# Altium footprint library PcbLib1.PcbLib: 1009 footprints (part 27 of 64)
Each footprint in its own frame and in the unit in brackets; x right, y up, seen from the top. Pads: shape width x height; smd on the part's side, far side on the other; paste and mask are expansions set on the pad; w line width, h text height; cw(c..) or ccw(c..) is an arc to the next point about the centre after c.
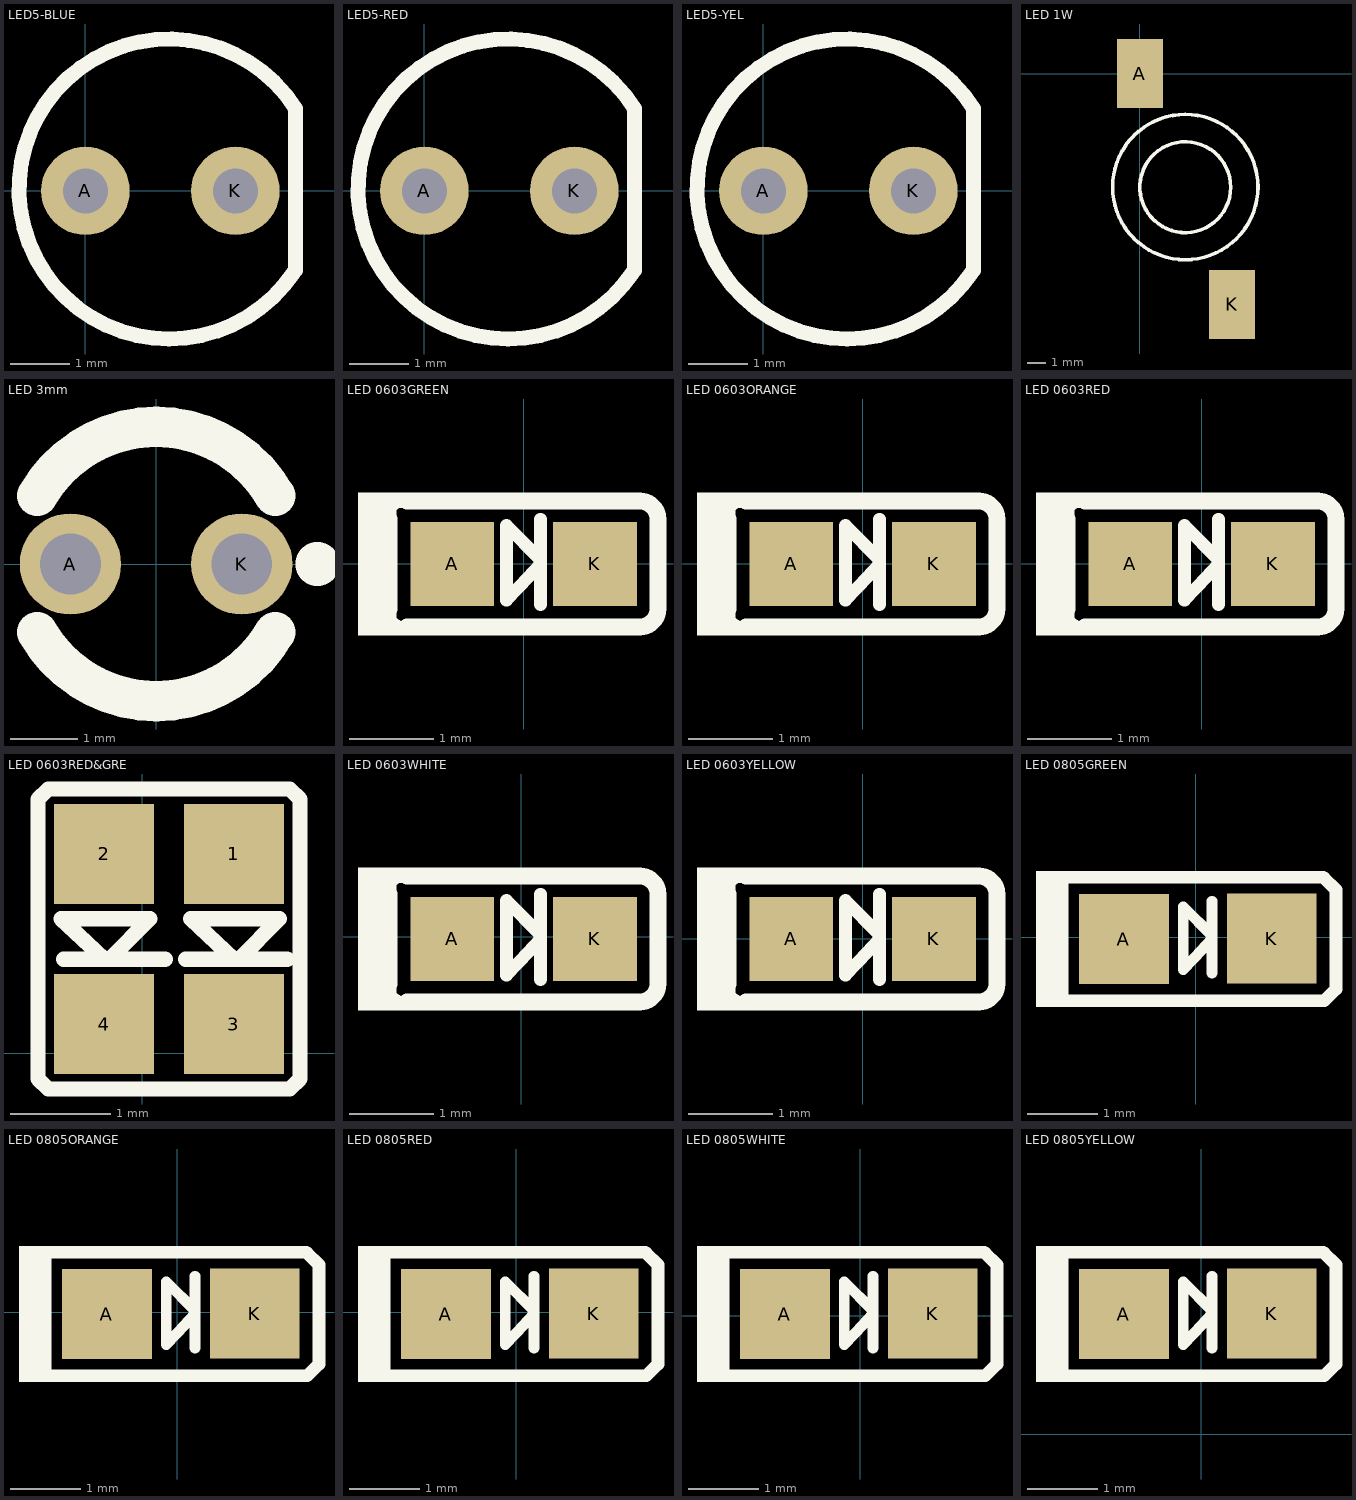
[diagram p26: the footprints below, top view; thin cyan lines are the x and y axes]

## LED5-BLUE [mm]
pads (2):
  round 1.5 hole 0.762: A(0,0) K(2.54,0)
Top Overlay:
  lines w0.254: 3.528,-1.378 cw(c1.415,0.031) 3.556,1.397 3.556,-1.35
3D body "LED5_BLUE.STEP": height 8.6, standoff -2, extent -1.58,-2.85 3.77,2.85

## LED5-RED [mm]
pads (2):
  round 1.5 hole 0.762: A(0,0) K(2.54,0)
Top Overlay:
  lines w0.254: 3.528,-1.378 cw(c1.415,0.031) 3.556,1.397 3.556,-1.35
3D body "LED5_RED.STEP": height 8.6, standoff -2, extent -1.58,-2.85 3.77,2.85

## LED5-YEL [mm]
pads (2):
  round 1.5 hole 0.762: A(0,0) K(2.54,0)
Top Overlay:
  lines w0.254: 3.528,-1.378 cw(c1.415,0.031) 3.556,1.397 3.556,-1.35
3D body "LED5_YEL.STEP": height 8.6, standoff -2, extent -1.58,-2.85 3.77,2.85

## LED 1W [mm]
pads (2):
  rect 2.54x3.81 smd: A(0,0) K(5.08,-12.7)
Top Overlay:
  circle w0.2: c2.5,-6.242 r4
  circle w0.2: c2.5,-6.25 r2.5
3D body: height 0.5, standoff 0.25, extent -1,-1.5 1,1.5
3D body: height 0.5, standoff 0.25, extent 4,-14.25 6,-11
3D body: height 5.55, standoff 0.55, extent 0.026,-8.729 5,-3.75
3D body: height 3.25, standoff 0.25, extent -1.468,-10.234 6.5,-2.25
3D body: height 0.89, standoff 0.25, extent 4,-11 6,-8
3D body: height 0.89, standoff 0.25, extent -1,-5.25 1,-1.5

## LED 3mm [mm]
pads (2):
  round 1.5 hole 0.9 mask+0.051: A(-1.27,0) K(1.27,0)
Top Overlay:
  circle w0.6: c2.388,0 r0.025
  lines w0.6: -1.764,-1.008 ccw(c0,0) 1.764,-1.008 ; -1.764,1.008 cw(c0,0) 1.764,1.008

## LED 0603GREEN [mm]
pads (2):
  rect 1x1 smd paste+0 mask+0: A(-0.85,0) K(0.85,0)
Top Overlay:
  rectangle: -1.782,-0.851 -1.198,-0.686
  rectangle: -1.973,-0.851 -1.516,0.851
  rectangle: -1.782,0.665 -1.132,0.851
  lines w0.102: -1.602,-0.533 ccw(c-1.386,-0.533) -1.386,-0.749 ; -1.602,0.533 cw(c-1.386,0.533) -1.386,0.749
  lines w0.152: 0.203,-0.483 0.203,0.533 ; 0.203,0 -0.203,-0.432 -0.203,0.457 0.203,0.051
  lines w0.2: 1.386,-0.749 ccw(c1.386,-0.533) 1.602,-0.533 ; 1.386,0.749 cw(c1.386,0.533) 1.602,0.533
  lines w0.203: -1.602,-0.533 -1.602,0.533 ; -1.386,-0.749 1.386,-0.749 ; -1.386,0.749 1.386,0.749 ; 1.602,-0.533 1.602,0.533
3D body: height 0.46, standoff 0, extent -0.301,-0.464 0.493,0.402
3D body: height 0.38, standoff 0, extent -0.502,-0.533 0.668,0.533
3D body: height 0.38, standoff 0, extent -0.925,-0.535 -0.5,0.535
3D body: height 0.38, standoff 0, extent 0.664,-0.532 1.089,0.532
3D body: height 0.46, standoff 0, extent -0.267,-0.254 0.268,0.305

## LED 0603ORANGE [mm]
pads (2):
  rect 1x1 smd paste+0 mask+0: A(-0.85,0) K(0.85,0)
Top Overlay:
  rectangle: -1.782,0.665 -1.132,0.851
  rectangle: -1.973,-0.851 -1.516,0.851
  rectangle: -1.782,-0.851 -1.198,-0.686
  lines w0.102: -1.602,-0.533 ccw(c-1.386,-0.533) -1.386,-0.749 ; -1.602,0.533 cw(c-1.386,0.533) -1.386,0.749
  lines w0.152: 0.203,-0.483 0.203,0.533 ; 0.203,0 -0.203,-0.432 -0.203,0.457 0.203,0.051
  lines w0.2: 1.386,-0.749 ccw(c1.386,-0.533) 1.602,-0.533 ; 1.386,0.749 cw(c1.386,0.533) 1.602,0.533
  lines w0.203: -1.602,-0.533 -1.602,0.533 ; -1.386,-0.749 1.386,-0.749 ; -1.386,0.749 1.386,0.749 ; 1.602,-0.533 1.602,0.533
3D body: height 0.46, standoff 0, extent -0.301,-0.464 0.493,0.402
3D body: height 0.38, standoff 0, extent -0.502,-0.533 0.668,0.533
3D body: height 0.38, standoff 0, extent -0.925,-0.535 -0.5,0.535
3D body: height 0.38, standoff 0, extent 0.664,-0.532 1.089,0.532
3D body: height 0.46, standoff 0, extent -0.267,-0.254 0.268,0.305

## LED 0603RED [mm]
pads (2):
  rect 1x1 smd paste+0 mask+0: A(-0.85,0) K(0.85,0)
Top Overlay:
  rectangle: -1.782,-0.851 -1.198,-0.686
  rectangle: -1.973,-0.851 -1.516,0.851
  rectangle: -1.782,0.665 -1.132,0.851
  lines w0.102: -1.602,-0.533 ccw(c-1.386,-0.533) -1.386,-0.749 ; -1.602,0.533 cw(c-1.386,0.533) -1.386,0.749
  lines w0.152: 0.203,-0.483 0.203,0.533 ; 0.203,0 -0.203,-0.432 -0.203,0.457 0.203,0.051
  lines w0.2: 1.386,-0.749 ccw(c1.386,-0.533) 1.602,-0.533 ; 1.386,0.749 cw(c1.386,0.533) 1.602,0.533
  lines w0.203: -1.602,-0.533 -1.602,0.533 ; -1.386,-0.749 1.386,-0.749 ; -1.386,0.749 1.386,0.749 ; 1.602,-0.533 1.602,0.533
3D body: height 0.38, standoff 0, extent 0.664,-0.532 1.089,0.532
3D body: height 0.38, standoff 0, extent -0.925,-0.535 -0.5,0.535
3D body: height 0.38, standoff 0, extent -0.502,-0.533 0.668,0.533
3D body: height 0.46, standoff 0, extent -0.301,-0.464 0.493,0.402
3D body: height 0.46, standoff 0, extent -0.267,-0.254 0.268,0.305

## LED 0603RED&GRE [mm]
pads (4):
  rect 1x1 smd paste+0 mask+0: 1(0.914,1.993) 2(-0.381,1.993) 3(0.914,0.293) 4(-0.381,0.293)
Top Overlay:
  lines w0.152: -0.787,0.94 0.229,0.94 ; -0.381,0.94 -0.813,1.346 0.076,1.346 -0.33,0.94 ; 0.432,0.94 1.448,0.94 ; 0.914,0.94 0.483,1.346 1.372,1.346 0.965,0.94 ; -1.041,-0.254 -1.041,2.54 -0.94,2.642 1.473,2.642 1.575,2.54 1.575,-0.254 1.473,-0.356 -0.94,-0.356 -1.041,-0.254
3D body: height 0.46, standoff 0, extent -0.845,0.65 0.021,1.444
3D body: height 0.38, standoff 0, extent -0.914,0.475 0.152,1.645
3D body: height 0.38, standoff 0, extent -0.916,1.643 0.154,2.068
3D body: height 0.38, standoff 0, extent -0.913,0.054 0.151,0.479
3D body: height 0.46, standoff 0, extent 0.45,0.65 1.316,1.444
3D body: height 0.38, standoff 0, extent 0.381,0.475 1.448,1.645
3D body: height 0.38, standoff 0, extent 0.38,1.643 1.449,2.068
3D body: height 0.38, standoff 0, extent 0.383,0.054 1.446,0.479
3D body: height 0.46, standoff 0, extent -0.635,0.875 -0.076,1.41
3D body: height 0.46, standoff 0, extent 0.661,0.875 1.219,1.41

## LED 0603WHITE [mm]
pads (2):
  rect 1x1 smd paste+0 mask+0: A(-0.825,-0.025) K(0.875,-0.025)
Top Overlay:
  rectangle: -1.757,0.64 -1.107,0.825
  rectangle: -1.947,-0.876 -1.49,0.825
  rectangle: -1.757,-0.876 -1.173,-0.711
  lines w0.102: -1.576,-0.559 ccw(c-1.36,-0.559) -1.36,-0.775 ; -1.576,0.508 cw(c-1.36,0.508) -1.36,0.724
  lines w0.152: 0.229,-0.508 0.229,0.508 ; 0.229,-0.025 -0.178,-0.457 -0.178,0.432 0.229,0.025
  lines w0.2: 1.411,-0.775 ccw(c1.411,-0.559) 1.627,-0.559 ; 1.411,0.724 cw(c1.411,0.508) 1.627,0.508
  lines w0.203: -1.576,-0.559 -1.576,0.508 ; -1.36,-0.775 1.411,-0.775 ; -1.36,0.724 1.411,0.724 ; 1.627,-0.559 1.627,0.508
3D body: height 0.46, standoff 0, extent -0.242,-0.279 0.293,0.28
3D body: height 0.5, standoff 0, extent -0.965,-0.66 -0.737,0.61
3D body: height 0.5, standoff 0, extent 0.787,-0.66 1.016,0.61
3D body: height 0.5, standoff 0, extent -0.737,-0.66 0.787,0.61

## LED 0603YELLOW [mm]
pads (2):
  rect 1x1 smd paste+0 mask+0: A(-0.85,0) K(0.85,0)
Top Overlay:
  rectangle: -1.782,-0.851 -1.198,-0.686
  rectangle: -1.973,-0.851 -1.516,0.851
  rectangle: -1.782,0.665 -1.132,0.851
  lines w0.102: -1.602,-0.533 ccw(c-1.386,-0.533) -1.386,-0.749 ; -1.602,0.533 cw(c-1.386,0.533) -1.386,0.749
  lines w0.152: 0.203,-0.483 0.203,0.533 ; 0.203,0 -0.203,-0.432 -0.203,0.457 0.203,0.051
  lines w0.2: 1.386,-0.749 ccw(c1.386,-0.533) 1.602,-0.533 ; 1.386,0.749 cw(c1.386,0.533) 1.602,0.533
  lines w0.203: -1.602,-0.533 -1.602,0.533 ; -1.386,-0.749 1.386,-0.749 ; -1.386,0.749 1.386,0.749 ; 1.602,-0.533 1.602,0.533
3D body: height 0.38, standoff 0, extent 0.664,-0.532 1.089,0.532
3D body: height 0.38, standoff 0, extent -0.925,-0.535 -0.5,0.535
3D body: height 0.38, standoff 0, extent -0.502,-0.533 0.668,0.533
3D body: height 0.46, standoff 0, extent -0.301,-0.464 0.493,0.402
3D body: height 0.46, standoff 0, extent -0.267,-0.254 0.268,0.305

## LED 0805GREEN [mil]
pads (2):
  rect 50x50 smd: A(-40,-1) K(42.3,-0.8)
Top Overlay:
  rectangle: -89,-39 -71,37
  lines w6: 9,-20 9,20 ; 9,-1 -7,-18 -7,17 9,1
  lines w7: -83,33.5 70.98,33.5 71.48,33 78.06,26.42 78.06,-28.94 71.5,-35.5 -78,-35.5
  lines w8: -75.06,-23.44 -75.06,20
3D body: height 15, standoff 0, extent 24.15,-21.93 40.88,19.93
3D body: height 15, standoff 0, extent -38.41,-22.04 -21.68,20.04
3D body: height 15, standoff 0, extent -21.75,-22 24.31,20
3D body: height 18, standoff 0, extent -13.62,-18.04 17.63,16.05
3D body: height 18, standoff 0, extent -9.52,-11 11.53,11

## LED 0805ORANGE [mil]
pads (2):
  rect 50x50 smd: A(-39,-1) K(43.3,-0.8)
Top Overlay:
  rectangle: -88,-39 -70,37
  lines w6: 10,-20 10,20 ; 10,-1 -6,-18 -6,17 10,1
  lines w7: -82,33.5 71.98,33.5 72.48,33 79.06,26.42 79.06,-28.94 72.5,-35.5 -77,-35.5
  lines w8: -74.06,-23.44 -74.06,20
3D body: height 15, standoff 0, extent 25.15,-21.93 41.88,19.93
3D body: height 15, standoff 0, extent -37.41,-22.04 -20.68,20.04
3D body: height 15, standoff 0, extent -20.75,-22 25.31,20
3D body: height 18, standoff 0, extent -12.62,-18.04 18.63,16.05
3D body: height 18, standoff 0, extent -8.52,-11 12.53,11

## LED 0805RED [mil]
pads (2):
  rect 50x50 smd: A(-39,-1) K(43.3,-0.8)
Top Overlay:
  rectangle: -88,-39 -70,37
  lines w6: 10,-20 10,20 ; 10,-1 -6,-18 -6,17 10,1
  lines w7: -82,33.5 71.98,33.5 72.48,33 79.06,26.42 79.06,-28.94 72.5,-35.5 -77,-35.5
  lines w8: -74.06,-23.44 -74.06,20
3D body: height 15, standoff 0, extent 24.15,-21.93 40.88,19.93
3D body: height 15, standoff 0, extent -38.41,-22.04 -21.68,20.04
3D body: height 15, standoff 0, extent -21.75,-22 24.31,20
3D body: height 18, standoff 0, extent -13.62,-18.04 17.63,16.05
3D body: height 18, standoff 0, extent -8.52,-11 12.53,11

## LED 0805WHITE [mil] "1/8W"
pads (2):
  rect 50x50 smd: A(-42,1) K(40.3,1.2)
Top Overlay:
  rectangle: -91,-37 -73,39
  lines w6: 7,-18 7,22 ; 7,1 -9,-16 -9,19 7,3
  lines w7: -85,35.5 68.98,35.5 69.48,35 76.06,28.42 76.06,-26.94 69.5,-33.5 -80,-33.5
  lines w8: -77.06,-21.44 -77.06,22
3D body: height 18, standoff 0, extent -11.52,-9 9.53,13
3D body: height 19.68, standoff 0, extent -40,-24 -31,26
3D body: height 19.68, standoff 0, extent 29,-24 38,26
3D body: height 19.68, standoff 0, extent -31,-24 29,26

## LED 0805YELLOW [mil]
pads (2):
  rect 50x50 smd: A(-43,67) K(39.3,67.2)
Top Overlay:
  rectangle: -92,29 -74,105
  lines w6: 6,48 6,88 ; 6,67 -10,50 -10,85 6,69
  lines w7: -86,101.5 67.98,101.5 68.48,101 75.06,94.42 75.06,39.06 68.5,32.5 -81,32.5
  lines w8: -78.06,44.56 -78.06,88
3D body: height 15, standoff 0, extent 20.15,46.07 36.88,87.93
3D body: height 15, standoff 0, extent -42.41,45.96 -25.68,88.04
3D body: height 15, standoff 0, extent -25.75,46 20.31,88
3D body: height 18, standoff 0, extent -17.85,48.72 13.4,82.81
3D body: height 18, standoff 0, extent -16.53,55 4.53,77